# Altium footprint library TSC Footprints.PcbLib: 99 footprints (part 4 of 7)
Each footprint in its own frame and in the unit in brackets; x right, y up, seen from the top. Pads: shape width x height; smd on the part's side, far side on the other; paste and mask are expansions set on the pad; w line width, h text height; cw(c..) or ccw(c..) is an arc to the next point about the centre after c.
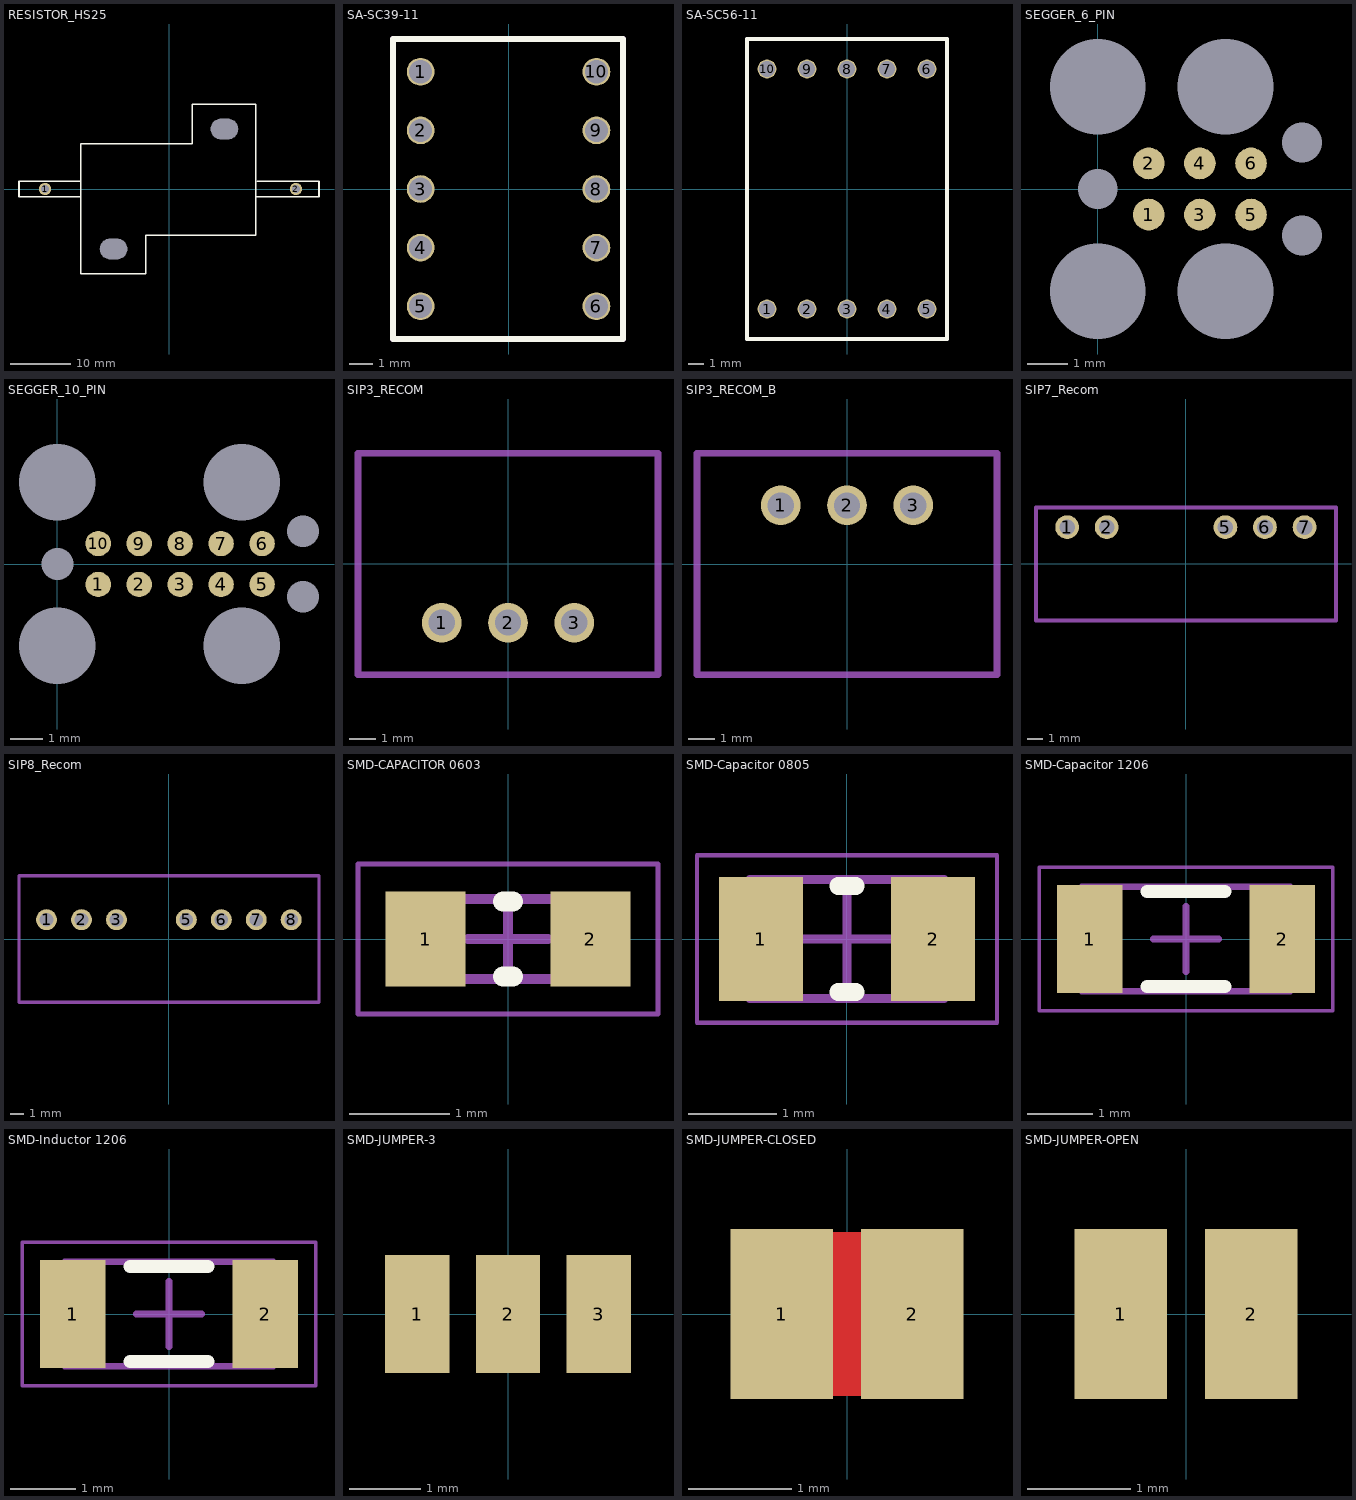
[diagram p3: the footprints below, top view; thin cyan lines are the x and y axes]

## RESISTOR_HS25 [mm] "Power resistor by arcol"
height 14.8
pads (4):
  round 2 hole 1.3: 1(-20.47,0) 2(20.955,0)
  round 0 hole 3.4 slot 4.5 at 0 deg unplated: ""(-9.15,-9.9) ""(9.15,9.9)
Top Overlay:
  lines w0.254: -14.605,-1.27 -24.765,-1.27 -24.765,1.27 -14.605,1.27 ; 14.351,-1.27 24.765,-1.27 24.765,1.27 14.605,1.27 ; -14.605,-13.97 -3.81,-13.97 -3.81,-7.62 14.351,-7.62 14.351,13.97 3.81,13.97 3.81,7.493 -14.605,7.493 -14.605,-13.97
3D body "POWER RESISTOR WH25.stp": height 14.21, standoff -0.22, extent -24.175,-13.716 24.225,13.571

## SA-SC39-11 [mm] "Kingbright SA-SC39-11 footprint"
height 7
pads (10):
  round 1.2 hole 1: 1(-3.81,5.08) 2(-3.81,2.54) 3(-3.81,0) 4(-3.81,-2.54) 5(-3.81,-5.08) 6(3.81,-5.08) 7(3.81,-2.54) 8(3.81,0) 9(3.81,2.54) 10(3.81,5.08)
Top Overlay:
  lines w0.254: -5,-6.5 -5,6.5 4.955,6.5 4.955,-6.5 -5,-6.5
Mechanical 15:
  lines w0.254: -5,-6.5 -5,6.5 4.955,6.5 4.955,-6.5 -5,-6.5
3D body "SA-SC39-11.STEP": height 7, standoff -4, extent -5,-6.5 5,6.5

## SA-SC56-11 [mm] "Kingbright SA-SC56-11 footprint"
height 8
pads (10):
  round 1.2 hole 1: 1(-5.08,-7.62) 2(-2.54,-7.62) 3(0,-7.62) 4(2.54,-7.62) 5(5.08,-7.62) 6(5.08,7.62) 7(2.54,7.62) 8(0,7.62) 9(-2.54,7.62) 10(-5.08,7.62)
Top Overlay:
  lines w0.254: -6.35,-9.525 6.35,-9.525 6.35,9.525 -6.35,9.525 -6.35,-9.525
Mechanical 15:
  lines w0.254: -6.35,-9.525 6.35,-9.525 6.35,9.525 -6.35,9.525 -6.35,-9.525
3D body "SA-SC56-11.STEP": height 8, standoff -4, extent -6.35,-9.525 6.35,9.525

## SEGGER_6_PIN [mm]
pads (13):
  round 0.787 smd: 1(1.27,-0.635) 2(1.27,0.635) 3(2.54,-0.635) 4(2.54,0.635) 5(3.81,-0.635) 6(3.81,0.635)
  round 0 hole 2.375 unplated: ""(0,-2.54) ""(0,2.54) ""(3.175,-2.54) ""(3.175,2.54)
  round 0 hole 0.991 unplated: ""(0,0) ""(5.08,-1.16) ""(5.08,1.16)

## SEGGER_10_PIN [mm]
pads (17):
  round 0.787 smd: 1(1.27,-0.635) 2(2.54,-0.635) 3(3.81,-0.635) 4(5.08,-0.635) 5(6.35,-0.635) 6(6.35,0.635) 7(5.08,0.635) 8(3.81,0.635) 9(2.54,0.635) 10(1.27,0.635)
  round 0 hole 2.375 unplated: ""(0,-2.54) ""(0,2.54) ""(5.715,-2.54) ""(5.715,2.54)
  round 0 hole 0.991 unplated: ""(0,0) ""(7.62,-1.015) ""(7.62,1.015)

## SIP3_RECOM [mm]
height 10.4
pads (3):
  round 1.524 hole 1: 1(-2.54,-2.25) 2(0,-2.25) 3(2.54,-2.25)
Mechanical 13:
  lines w0.254: -5.75,-4.25 -5.75,4.25 5.75,4.25 5.75,-4.25 -5.75,-4.25
3D body: height 10.4, standoff 0, extent -5.75,-4.25 5.75,4.25

## SIP3_RECOM_B [mm]
height 10.4
pads (3):
  round 1.524 hole 1: 1(-2.54,2.25) 2(0,2.25) 3(2.54,2.25)
Mechanical 13:
  lines w0.254: -5.75,-4.25 -5.75,4.25 5.75,4.25 5.75,-4.25 -5.75,-4.25
3D body: height 10.4, standoff 0, extent -5.75,-4.25 5.75,4.25

## SIP7_Recom [mm]
height 10.2
pads (5):
  round 1.524 hole 1: 1(-7.62,2.365) 2(-5.08,2.365) 5(2.54,2.365) 6(5.08,2.365) 7(7.62,2.365)
Mechanical 1:
  lines w0.254: -9.62,-3.635 -9.62,3.635 9.64,3.635 9.64,-3.635 -9.62,-3.635
3D body: height 11.1, standoff 0.5, extent -9.62,-3.635 9.64,3.635

## SIP8_Recom [mm]
height 11.1
pads (7):
  round 1.524 hole 1: 1(-8.89,1.4) 2(-6.35,1.4) 3(-3.81,1.4) 5(1.27,1.4) 6(3.81,1.4) 7(6.35,1.4) 8(8.89,1.4)
Mechanical 1:
  lines w0.254: -10.89,-4.6 -10.89,4.6 10.91,4.6 10.91,-4.6 -10.89,-4.6
3D body: height 11.1, standoff 0.5, extent -10.89,-4.6 10.91,4.6

## SMD-CAPACITOR 0603 [mm] "Chip Capacitor, 0603"
height 0.8
pads (2):
  rect 0.8x0.95 smd: 1(-0.825,0) 2(0.825,0)
Top Overlay:
  lines w0.2: -0.05,-0.375 0.05,-0.375 ; -0.05,0.375 0.05,0.375
Mechanical 13:
  lines w0.1: -0.8,-0.4 -0.8,0.4 0.8,0.4 0.8,-0.4 -0.8,-0.4
Mechanical 15:
  lines w0.05: -1.5,-0.75 -1.5,0.75 1.5,0.75 1.5,-0.75 -1.5,-0.75
  lines w0.1: -0.4,0 0.4,0 ; 0,-0.4 0,0.4
3D body "CAPC1608X08N.step": height 0.8, standoff 0, extent -0.8,-0.4 0.8,0.4

## SMD-Capacitor 0805 [mm] "Chip Capacitor, 0805"
height 1.4
pads (2):
  rect 0.95x1.4 smd: 1(-0.975,0) 2(0.975,0)
Top Overlay:
  lines w0.2: -0.1,-0.6 0.1,-0.6 ; -0.1,0.6 0.1,0.6
Mechanical 13:
  lines w0.1: -1.1,-0.675 1.1,-0.675 1.1,0.675 -1.1,0.675 -1.1,-0.675
Mechanical 15:
  lines w0.05: -1.7,-0.95 1.7,-0.95 1.7,0.95 -1.7,0.95 -1.7,-0.95
  lines w0.1: -0.5,0 0.5,0 ; 0,-0.5 0,0.5
3D body "SMD-Capacitor.step": height 1.4, standoff 0, extent -1.1,-0.675 1.1,0.675

## SMD-Capacitor 1206 [mm] "Chip Capacitor, 1206"
height 1.4
pads (2):
  rect 1x1.65 smd: 1(-1.475,0) 2(1.475,0)
Top Overlay:
  lines w0.2: -0.6,-0.725 0.6,-0.725 ; -0.6,0.725 0.6,0.725
Mechanical 13:
  lines w0.1: -1.6,-0.8 -1.6,0.8 1.6,0.8 1.6,-0.8 -1.6,-0.8
Mechanical 15:
  lines w0.05: -2.25,-1.1 -2.25,1.1 2.25,1.1 2.25,-1.1 -2.25,-1.1
  lines w0.1: -0.5,0 0.5,0 ; 0,-0.5 0,0.5
3D body "SMD-Capacitor 1206.step": height 1.4, standoff 0, extent -1.6,-0.8 1.6,0.8

## SMD-Inductor 1206 [mm] "Chip Inductor, 1206"
height 1.4
pads (2):
  rect 1x1.65 smd: 1(-1.475,0) 2(1.475,0)
Top Overlay:
  lines w0.2: -0.6,-0.725 0.6,-0.725 ; -0.6,0.725 0.6,0.725
Mechanical 13:
  lines w0.1: -1.6,-0.8 -1.6,0.8 1.6,0.8 1.6,-0.8 -1.6,-0.8
Mechanical 15:
  lines w0.05: -2.25,-1.1 -2.25,1.1 2.25,1.1 2.25,-1.1 -2.25,-1.1
  lines w0.1: -0.5,0 0.5,0 ; 0,-0.5 0,0.5
3D body "SMD-Capacitor 1206.step": height 1.4, standoff 0, extent -1.6,-0.8 1.6,0.8

## SMD-JUMPER-3 [mm] "Jumper, SMD"
pads (3):
  rect 0.9x1.65 smd: 1(-1.27,0) 2(0,0) 3(1.27,0)

## SMD-JUMPER-CLOSED [mm] "Jumper, SMD"
pads (2):
  rect 1x1.65 smd: 1(-0.635,0) 2(0.635,0)
Top Layer:
  rectangle: -0.35,-0.8 0.35,0.8

## SMD-JUMPER-OPEN [mm] "Jumper, SMD"
pads (2):
  rect 0.9x1.65 smd: 1(-0.635,0) 2(0.635,0)